# Altium footprint library BIRD.PcbLib: 23 footprints (part 2 of 2)
Each footprint in its own frame and in the unit in brackets; x right, y up, seen from the top. Pads: shape width x height; smd on the part's side, far side on the other; paste and mask are expansions set on the pad; w line width, h text height; cw(c..) or ccw(c..) is an arc to the next point about the centre after c.
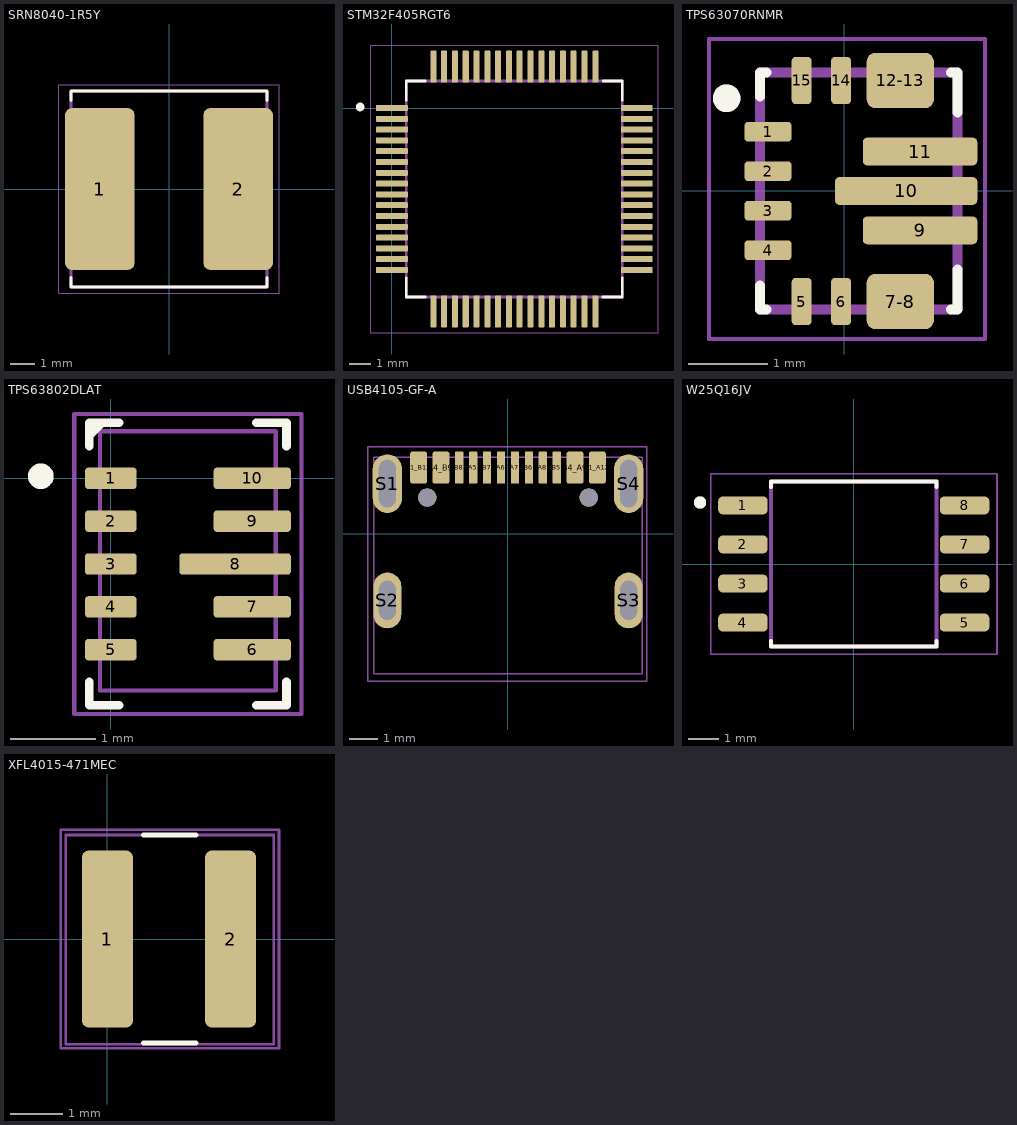
[diagram p1: the footprints below, top view; thin cyan lines are the x and y axes]

## SRN8040-1R5Y [mm] "1.5 µH Semi-Shielded Drum Core, Wirewound Inductor 7 A 11mOhm Max Nonstandard"
pads (2):
  rrect20% 2.85x6.6 smd: 1(-2.825,0) 2(2.825,0)
Top Overlay:
  lines w0.127: -4,-3.615 -4,-4 4,-4 4,-3.615 ; -4,3.615 -4,4 4,4 4,3.615
Mechanical 13:
  lines w0.127: -4,-4 4,-4 4,4 -4,4 -4,-4
Mechanical 15:
  lines w0.05: -4.5,-4.25 4.5,-4.25 4.5,4.25 -4.5,4.25 -4.5,-4.25
3D body "SRN8040.STEP": height 4, standoff 0, extent -4,-4 4,4

## STM32F405RGT6 [mm] "ARM Microcontrollers - MCU ARM M4 1024 FLASH 168 Mhz 192kB SRAM"
pads (64):
  rrect25% 1.47x0.28 smd: 1(0,0) 2(0,-0.5) 3(0,-1) 4(0,-1.5) 5(0,-2) 6(0,-2.5) 7(0,-3) 8(0,-3.5) 9(0,-4) 10(0,-4.5) 11(0,-5) 12(0,-5.5) 13(0,-6) 14(0,-6.5) 15(0,-7) 16(0,-7.5) 33(11.34,-7.5) 34(11.34,-7) 35(11.34,-6.5) 36(11.34,-6) 37(11.34,-5.5) 38(11.34,-5) 39(11.34,-4.5) 40(11.34,-4) 41(11.34,-3.5) 42(11.34,-3) 43(11.34,-2.5) 44(11.34,-2) 45(11.34,-1.5) 46(11.34,-1) 47(11.34,-0.5) 48(11.34,0)
  rrect25% 0.28x1.47 smd: 17(1.92,-9.42) 18(2.42,-9.42) 19(2.92,-9.42) 20(3.42,-9.42) 21(3.92,-9.42) 22(4.42,-9.42) 23(4.92,-9.42) 24(5.42,-9.42) 25(5.92,-9.42) 26(6.42,-9.42) 27(6.92,-9.42) 28(7.42,-9.42) 29(7.92,-9.42) 30(8.42,-9.42) 31(8.92,-9.42) 32(9.42,-9.42) 49(9.42,1.92) 50(8.92,1.92) 51(8.42,1.92) 52(7.92,1.92) 53(7.42,1.92) 54(6.92,1.92) 55(6.42,1.92) 56(5.92,1.92) 57(5.42,1.92) 58(4.92,1.92) 59(4.42,1.92) 60(3.92,1.92) 61(3.42,1.92) 62(2.92,1.92) 63(2.42,1.92) 64(1.92,1.92)
Top Overlay:
  circle w0.2: c-1.47,0.05 r0.1
  lines w0.127: 0.67,-7.875 0.67,-8.75 1.545,-8.75 ; 0.67,0.375 0.67,1.25 1.545,1.25 ; 9.762,-8.75 10.67,-8.75 10.67,-7.875 ; 9.795,1.25 10.67,1.25 10.67,0.375
Mechanical 13:
  lines w0.127: 0.67,-8.75 10.67,-8.75 10.67,1.25 0.67,1.25 0.67,-8.75
Mechanical 15:
  lines w0.05: -0.985,-10.405 12.325,-10.405 12.325,2.905 -0.985,2.905 -0.985,-10.405
3D body "STM32F405RGT6.stp": height 1.6, standoff 0, extent -0.34,-9.739 11.66,2.261

## TPS63070RNMR [mm] "Switching Voltage Regulators Wide input voltage (2V-16V) buck-boost converter 15-VQFN-HR -40 to 125"
pads (13):
  rrect40% 0.6x0.25 smd mask+0.05: 1(-0.962,0.75) 2(-0.962,0.25) 3(-0.962,-0.25) 4(-0.962,-0.75)
  rrect40% 0.25x0.6 smd mask+0.05: 5(-0.537,-1.4) 6(-0.038,-1.4) 14(-0.038,1.4) 15(-0.537,1.4)
  rrect30% 0.85x0.7 smd paste-2539.97 mask+0.05: 7-8(0.713,-1.4) 12-13(0.713,1.4)
  rrect30% 1.45x0.35 smd paste-2539.97 mask+0.05: 9(0.962,-0.5) 11(0.962,0.5)
  rrect30% 1.8x0.35 smd paste-2539.97 mask+0.05: 10(0.787,0)
Top Overlay:
  circle w0.2: c-1.488,1.175 r0.075
  lines w0.127: -1.062,-1.195 -1.062,-1.5 -0.982,-1.5 ; -1.062,1.195 -1.062,1.5 -0.982,1.5 ; 1.358,-1.5 1.438,-1.5 1.438,-0.995 ; 1.358,1.5 1.438,1.5 1.438,0.995
Top Paste:
  region: 1.607,-0.125 0.888,-0.125 0.888,0.125 1.607,0.125
  region: 1.638,-0.625 1.063,-0.625 1.063,-0.375 1.638,-0.375
  region: 1.638,0.375 1.063,0.375 1.063,0.625 1.638,0.625
  region: 0.863,-0.625 0.288,-0.625 0.288,-0.375 0.863,-0.375
  region: 0.863,0.375 0.288,0.375 0.288,0.625 0.863,0.625
  region: 0.687,-0.125 -0.032,-0.125 -0.032,0.125 0.687,0.125
  region: 1.088,1.1 0.337,1.1 0.337,1.7 0.587,1.7 0.587,1.35 0.838,1.35 0.838,1.7 1.088,1.7
  region: 1.088,-1.7 0.838,-1.7 0.838,-1.35 0.587,-1.35 0.587,-1.7 0.337,-1.7 0.337,-1.1 1.088,-1.1
Top Solder:
  region: 1.088,1.1 0.337,1.1 0.337,1.7 0.587,1.7 0.587,1.35 0.838,1.35 0.838,1.7 1.088,1.7
  region: 1.088,-1.7 0.838,-1.7 0.838,-1.35 0.587,-1.35 0.587,-1.7 0.337,-1.7 0.337,-1.1 1.088,-1.1
  region: 1.637,-0.625 0.288,-0.625 0.288,-0.375 1.637,-0.375
  region: 1.637,-0.125 -0.062,-0.125 -0.062,0.125 1.637,0.125
  region: 1.637,0.375 0.288,0.375 0.288,0.625 1.637,0.625
Mechanical 13:
  circle w0.2: c-1.488,1.175 r0.075
  lines w0.127: -1.062,-1.5 -1.062,1.5 1.438,1.5 1.438,-1.5 -1.062,-1.5
Mechanical 15:
  lines w0.05: -1.713,-1.875 1.788,-1.875 1.788,1.925 -1.713,1.925 -1.713,-1.875
3D body "TPS63070RNMR.STEP": height 1, standoff 0, extent -1.038,-1.5 1.462,1.5

## TPS63802DLAT [mm] "2-A, high-efficient, 11-µA quiescent current buck-boost converter in QFN/DFN package"
pads (10):
  rrect30% 0.6x0.25 smd mask+0.07: 1(0,0) 2(0,-0.5) 3(0,-1) 4(0,-1.5) 5(0,-2)
  rrect30% 0.9x0.25 smd mask+0.07: 6(1.65,-2) 7(1.65,-1.5) 9(1.65,-0.5) 10(1.65,0)
  rrect30% 1.3x0.25 smd mask+0.07: 8(1.45,-1)
Top Overlay:
  lines w0.1: -0.25,-2.375 -0.25,-2.65 0.1,-2.65 ; -0.25,0.375 -0.25,0.65 0.1,0.65 ; -0.075,0.65 -0.1,0.65 -0.25,0.5 ; 1.7,-2.65 2.05,-2.65 2.05,-2.375 ; 1.7,0.65 2.05,0.65 2.05,0.375 ; -0.25,0.5 -0.25,0.5
  lines w0.2: -0.817,-0.026 ccw(c-0.817,0.024) -0.817,0.074 ccw(c-0.817,0.024) -0.817,-0.026
Mechanical 13:
  lines w0.05: -0.125,-2.475 1.925,-2.475 1.925,0.55 -0.125,0.55 -0.125,-2.475
Mechanical 15:
  lines w0.05: -0.425,-2.75 2.225,-2.75 2.225,0.75 -0.425,0.75 -0.425,-2.75
3D body "TPS63802DLAT.stp": height 1.1, standoff 0, extent -0.1,-2.475 1.9,0.525

## USB4105-GF-A [mm] "USB-C (USB TYPE-C) USB 2.0 Receptacle Connector 24 (16+8 Dummy) Position Surface Mount, Right Angle; Through Hole"
pads (18):
  rrect25% 0.6x1.15 smd mask+0.05: A1_B12(-3.2,2.378) A4_B9(-2.4,2.378) B1_A12(3.2,2.378) B4_A9(2.4,2.378)
  rrect25% 0.3x1.15 smd mask+0.05: A5(-1.25,2.378) A6(-0.25,2.378) A7(0.25,2.378) A8(1.25,2.378) B5(1.75,2.378) B6(0.75,2.378) B7(-0.75,2.378) B8(-1.75,2.378)
  oval 1.05x2.1 hole 0.6 slot 1.7 at 90 deg: S1(-4.32,1.803) S4(4.32,1.803)
  oval 1x2 hole 0.6 slot 1.4 at 90 deg: S2(-4.32,-2.377) S3(4.32,-2.377)
  round 0.65 hole 0.65 unplated mask+0.05: ""(-2.89,1.303) ""(2.89,1.303)
Mechanical 13:
  lines w0.05: -4.8,-5 4.8,-5 4.8,2.75 -4.8,2.75 -4.8,-5
Mechanical 15:
  lines w0.05: -5.025,-5.275 4.975,-5.275 4.975,3.125 -5.025,3.125 -5.025,-5.275
3D body "USB4105-GF-A.STEP": height 3.31, standoff -0.85, extent -4.79,-4.985 4.79,2.725

## W25Q16JV [mm] "FLASH - NOR Memory IC 16Mbit SPI - Quad I/O 133 MHz 8-SOIC"
pads (8):
  rrect50% 1.61x0.58 smd: 1(-3.605,1.905) 2(-3.605,0.635) 3(-3.605,-0.635) 4(-3.605,-1.905) 5(3.605,-1.905) 6(3.605,-0.635) 7(3.605,0.635) 8(3.605,1.905)
Top Overlay:
  circle w0.2: c-5,2 r0.1
  lines w0.127: -2.69,-2.51 -2.69,-2.69 2.69,-2.69 2.69,-2.51 ; -2.69,2.51 -2.69,2.69 2.69,2.69 2.69,2.51
Mechanical 13:
  circle w0.2: c-5,2 r0.1
  lines w0.127: -2.69,-2.69 2.69,-2.69 2.69,2.69 -2.69,2.69 -2.69,-2.69
Mechanical 15:
  lines w0.05: -4.66,-2.94 4.66,-2.94 4.66,2.94 -4.66,2.94 -4.66,-2.94
3D body "W25Q16JVSSIQ.STEP": height 2.16, standoff 0, extent -3.95,-2.64 3.95,2.64

## XFL4015-471MEC [mm] "Power Inductors - SMD 470nH Shld 11.2A 8.36mOhm AECQ2"
pads (2):
  rrect25% 0.98x3.4 smd: 1(0,0) 2(2.37,0)
Top Overlay:
  lines w0.1: 0.7,-2 1.7,-2 ; 0.7,2 1.7,2
Mechanical 13:
  lines w0.05: -0.8,-2.025 3.2,-2.025 3.2,2 -0.8,2 -0.8,-2.025
Mechanical 15:
  lines w0.05: -0.9,-2.1 -0.9,2.1 3.3,2.1 3.3,-2.1 -0.9,-2.1
3D body "XFL4015-471MEC.stp": height 1.5, standoff -0.1, extent -0.798,-2.015 3.202,1.985